# Altium footprint library PCBKU.PcbLib: 197 footprints (part 4 of 13)
Each footprint in its own frame and in the unit in brackets; x right, y up, seen from the top. Pads: shape width x height; smd on the part's side, far side on the other; paste and mask are expansions set on the pad; w line width, h text height; cw(c..) or ccw(c..) is an arc to the next point about the centre after c.
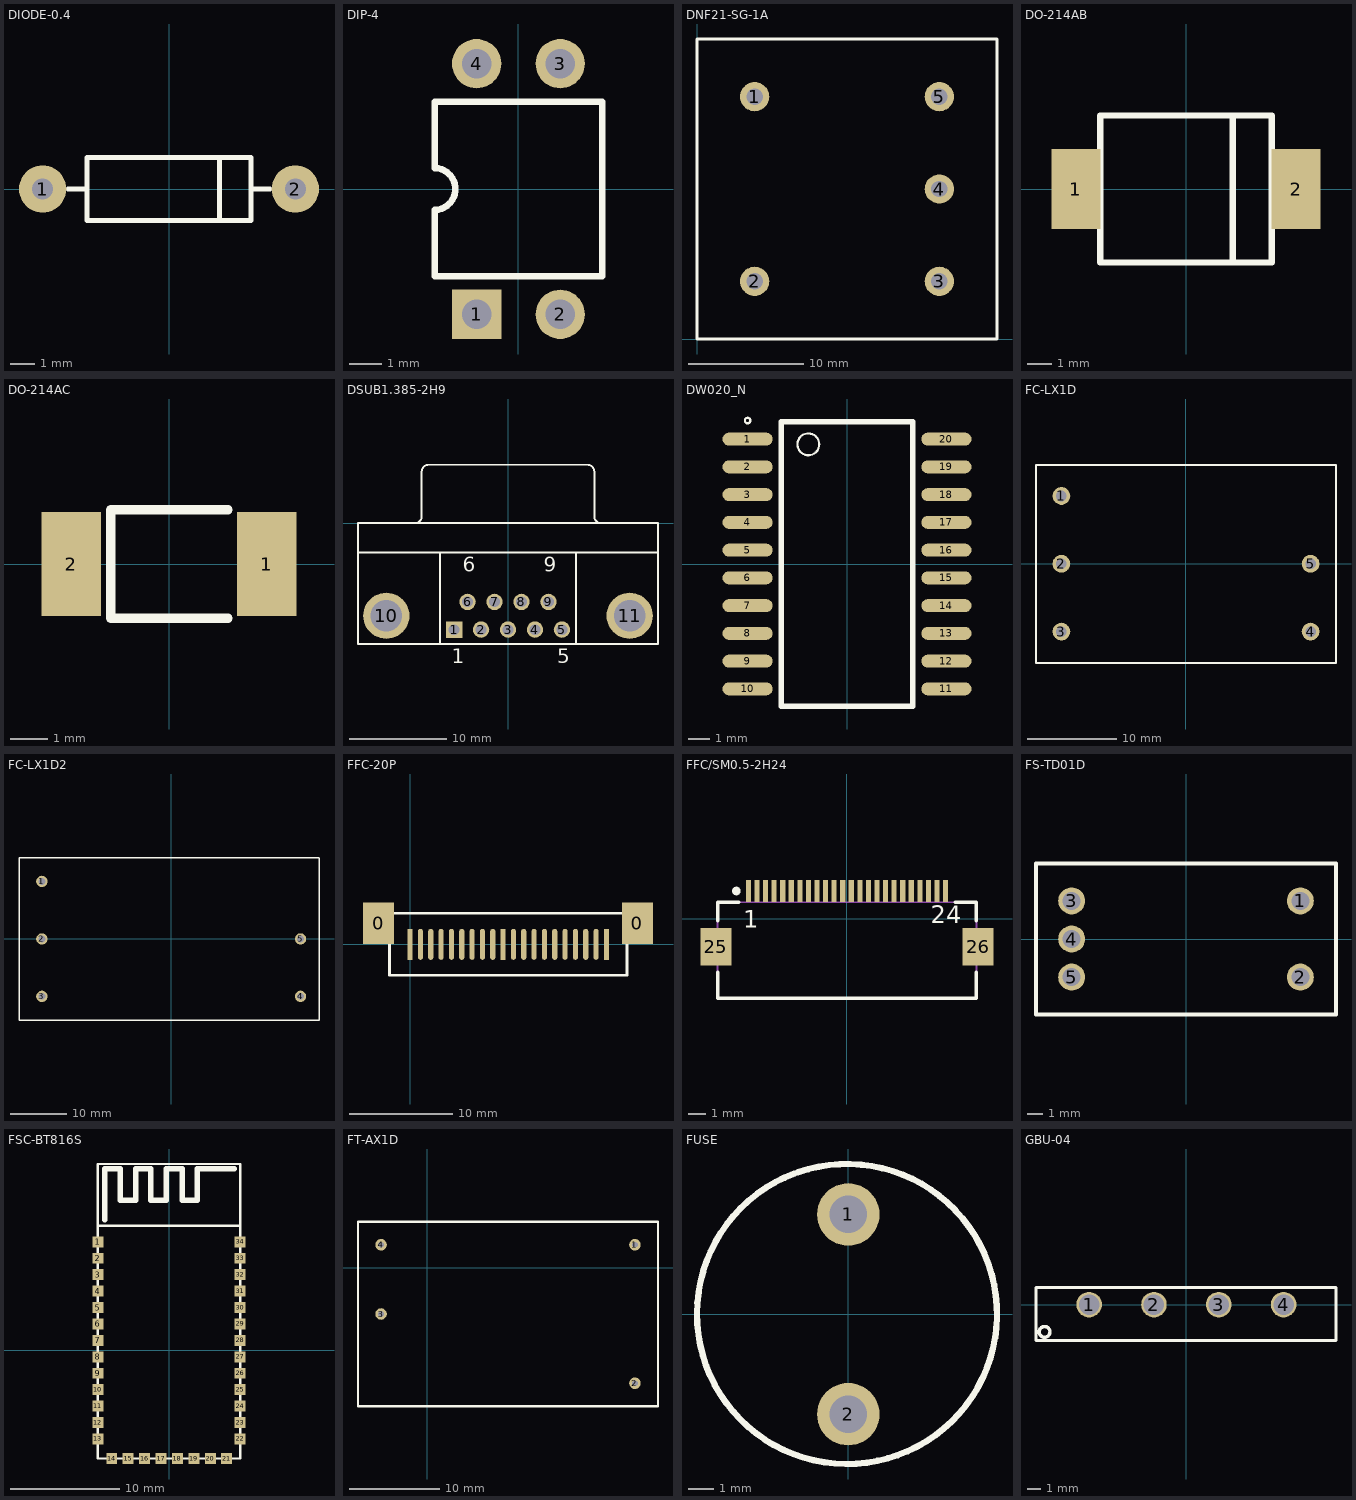
[diagram p3: the footprints below, top view; thin cyan lines are the x and y axes]

## DIODE-0.4 [mm]
pads (2):
  round 1.9 hole 0.85: 1(-5.08,0) 2(5.08,0)
Top Overlay:
  lines w0.2: -4.064,0 -3.302,0 ; 2.032,-1.27 2.032,1.27 ; 3.302,0 4.064,0 ; -3.302,-1.27 -3.302,1.27 3.302,1.27 3.302,-1.27 -3.302,-1.27
3D body: height 2, standoff -3.3, extent -5.53,-1.3 5.53,1.3

## DIP-4 [mm]
pads (4):
  rect 1.5x1.5 hole 0.9: 1(-1.27,-3.81)
  round 1.5 hole 0.9: 2(1.27,-3.81) 3(1.27,3.81) 4(-1.27,3.81)
Top Overlay:
  lines w0.2: -2.55,-2.65 2.55,-2.65 2.55,2.65 -2.55,2.65 -2.55,0.635 cw(c-2.55,0) -2.55,-0.635 -2.55,-2.65
3D body: height 3.8, standoff -3.5, extent -2.269,-3.986 2.311,3.884

## DNF21-SG-1A [mm]
height 1.1
pads (5):
  round 2.54 hole 1.397: 1(5,21) 2(5,5) 3(21,5) 4(21,13) 5(21,21)
Top Overlay:
  lines w0.25: 0,0 0,26 26,26 26,0 0,0

## DO-214AB [mm]
pads (2):
  rect 2x3.25 smd: 1(-4.5,0) 2(4.5,0)
Top Overlay:
  lines w0.254: 1.905,-3 1.905,3 ; -3.5,-3 3.5,-3 3.5,3 -3.5,3 -3.5,-3

## DO-214AC [mm]
pads (2):
  rect 1.6x2.8 smd: 1(2.623,0) 2(-2.623,0)
Top Overlay:
  lines w0.254: 1.582,-1.45 -1.568,-1.45 -1.568,1.45 1.582,1.45
3D body: height 2.24, standoff -0.04, extent -2.743,-1.346 2.743,1.448

## DSUB1.385-2H9 [mm] "Connector; D Subminiature; 9 Position; Right Angle; Pitch 1.385 mm"
height 12.75
pads (11):
  rect 1.69x1.69 hole 1.09: 1(-5.54,-10.92)
  round 1.69 hole 1.09: 2(-2.77,-10.92) 3(0,-10.92) 4(2.77,-10.92) 5(5.54,-10.92) 6(-4.155,-8.08) 7(-1.385,-8.08) 8(1.385,-8.08) 9(4.155,-8.08)
  round 4.76 hole 3.26: 10(-12.495,-9.5) 11(12.495,-9.5)
Top Overlay:
  lines w0.2: -15.4,-3 15.4,-3 ; -9.56,0.005 ccw(c-9.56,0.7) -8.865,0.7 -8.865,5.3 ; -8.86,5.305 cw(c-8.165,5.305) -8.165,6 8.165,6 cw(c8.165,5.305) 8.86,5.305 ; -7,-12.4 -7,-3 ; 7,-12.4 7,-3 ; 8.865,5.3 8.865,0.7 ccw(c9.56,0.7) 9.56,0.005 ; -15.4,-12.4 15.4,-12.4 15.4,0 -15.4,0 -15.4,-12.4
  text "6" at -4.655,-4.975 h1.5
  text "9" at 3.655,-4.975 h1.5
  text "5" at 5.04,-14.375 h1.5
  text "1" at -5.79,-14.375 h1.5

## DW020_N [mm]
height 1.1
pads (20):
  oval 2.3x0.6 smd: 1(-4.55,5.725) 2(-4.55,4.455) 3(-4.55,3.185) 4(-4.55,1.915) 5(-4.55,0.645) 6(-4.55,-0.625) 7(-4.55,-1.895) 8(-4.55,-3.165) 9(-4.55,-4.435) 10(-4.55,-5.705) 11(4.55,-5.705) 12(4.55,-4.435) 13(4.55,-3.165) 14(4.55,-1.895) 15(4.55,-0.625) 16(4.55,0.645) 17(4.55,1.915) 18(4.55,3.185) 19(4.55,4.455) 20(4.55,5.725)
Top Overlay:
  circle w0.1: c-1.77,5.486 r0.5
  circle w0.1: c-4.55,6.575 r0.125
  lines w0.25: -3,-6.49 3,-6.49 3,6.51 -3,6.51 -3,-6.49

## FC-LX1D [mm]
height 1.1
pads (5):
  round 2 hole 1.2: 1(-13.999,7.62) 2(-13.999,0) 3(-13.999,-7.62) 4(13.999,-7.62) 5(13.999,0)
Top Overlay:
  lines w0.254: 16.849,11.104 16.849,-11.151 -16.849,-11.151 -16.849,11.1 16.851,11.1
3D body: height 18, standoff -6, extent -16.825,-11.024 16.875,11.176

## FC-LX1D2 [mm]
height 1.1
pads (5):
  round 2 hole 1.2: 1(-22.86,10.16) 2(-22.86,-0.025) 3(-22.86,-10.16) 4(22.86,-10.16) 5(22.86,-0.025)
Top Overlay:
  lines w0.254: -26.9,-14.425 -26.9,14.375 26.1,14.375 ; -26.875,-14.429 26.125,-14.429 26.125,14.349

## FFC-20P [mm]
height 1.1
pads (22):
  rect 3x4 smd: 0(-3.048,2.032) 0(22,2.032)
  rect 0.5x3 smd: 1(0,0) 10(9,0) 20(19,0)
  oval 0.5x3 smd: 2(1,0) 3(2,0) 4(3,0) 5(4,0) 6(5,0) 7(6,0) 8(7,0) 9(8,0) 11(10,0) 12(11,0) 13(12,0) 14(13,0) 15(14,0) 16(15,0) 17(16,0) 18(17,0) 19(18,0)
Top Overlay:
  lines w0.25: -2,-3 21,-3 21,3 -2,3 -2,0 -2,-3

## FFC/SM0.5-2H24 [mm]
pads (26):
  rect 0.3x1.3 smd: 1(-5.75,1.625) 2(-5.25,1.625) 3(-4.75,1.625) 4(-4.25,1.625) 5(-3.75,1.625) 6(-3.25,1.625) 7(-2.75,1.625) 8(-2.25,1.625) 9(-1.75,1.625) 10(-1.25,1.625) 11(-0.75,1.625) 12(-0.25,1.625) 13(0.25,1.625) 14(0.75,1.625) 15(1.25,1.625) 16(1.75,1.625) 17(2.25,1.625) 18(2.75,1.625) 19(3.25,1.625) 20(3.75,1.625) 21(4.25,1.625) 22(4.75,1.625) 23(5.25,1.625) 24(5.75,1.625)
  rect 1.8x2.2 smd: 25(-7.65,-1.625) 26(7.65,-1.625)
Top Overlay:
  circle w0.25: c-6.45,1.625 r0.125
  lines w0.2: -7.55,-3.125 -7.55,-4.625 7.55,-4.625 7.55,-3.125 ; -7.55,-0.125 -7.55,0.975 -6.3,0.975 ; 6.3,0.975 7.55,0.975 7.55,-0.125
  text "1" at -6.045,-0.508 h1.02
  text "24" at 4.877,-0.254 h1.02
Mechanical 13:
  lines w0.1: -7.55,-4.625 7.55,-4.625 7.55,0.975 -7.55,0.975 -7.55,-4.625
3D body: height 2, standoff 0, extent -7.55,-4.625 7.55,0.975

## FS-TD01D [mm]
height 1.1
pads (5):
  round 1.8 hole 1.2: 1(7.62,2.54) 2(7.62,-2.54) 3(-7.62,2.54) 4(-7.62,0) 5(-7.62,-2.54)
Top Overlay:
  lines w0.254: -10,-5.04 10,-5.04 10,5.04 -10,5.04 -10,-5.04

## FSC-BT816S [mm]
pads (34):
  rect 1x1 smd: 1(-6.5,9.895) 2(-6.5,8.395) 3(-6.5,6.895) 4(-6.5,5.395) 5(-6.5,3.895) 6(-6.5,2.395) 7(-6.5,0.895) 8(-6.5,-0.605) 9(-6.5,-2.105) 10(-6.5,-3.605) 11(-6.5,-5.105) 12(-6.5,-6.605) 13(-6.5,-8.105) 14(-5.23,-9.895) 15(-3.73,-9.895) 16(-2.23,-9.895) 17(-0.73,-9.895) 18(0.77,-9.895) 19(2.27,-9.895) 20(3.77,-9.895) 21(5.27,-9.895) 22(6.5,-8.105) 23(6.5,-6.605) 24(6.5,-5.105) 25(6.5,-3.605) 26(6.5,-2.105) 27(6.5,-0.605) 28(6.5,0.895) 29(6.5,2.395) 30(6.5,3.895) 31(6.5,5.395) 32(6.5,6.895) 33(6.5,8.395) 34(6.5,9.895)
Top Overlay:
  lines w0.203: -6.401,11.355 6.449,11.355 ; -6.5,-9.895 6.5,-9.895 6.5,17.005 -6.5,17.005 -6.5,-9.895
  lines w0.5: -5.85,11.905 -5.85,16.555 -4.45,16.555 -4.45,13.705 -3.05,13.705 -3.05,16.555 -1.65,16.555 -1.65,13.705 -0.25,13.705 -0.25,16.555 1.2,16.555 1.2,13.705 2.6,13.705 2.6,16.555 5.95,16.555

## FT-AX1D [mm]
pads (4):
  round 1.27 hole 0.635: 1(22.86,2.54) 2(22.86,-12.7) 3(-5.08,-5.08) 4(-5.08,2.54)
Top Overlay:
  lines w0.254: -7.62,-15.24 25.4,-15.24 25.4,5.08 -7.62,5.08 -7.62,-15.24

## FUSE [mm]
pads (2):
  round 2.5 hole 1.5: 1(0,3.994) 2(0,-3.994)
Top Overlay:
  lines w0.254: -2.152,5.633 ccw(c-0.051,0.013) -2.01,5.684

## GBU-04 [mm]
pads (4):
  round 1.905 hole 1.524: 1(-7.245,0) 2(-2.415,0) 3(2.415,0) 4(7.245,0)
Top Overlay:
  circle w0.254: c-10.562,-2.032 r0.402
  lines w0.203: -11.201,-2.667 11.15,-2.667 11.15,1.27 -11.201,1.27 -11.201,-2.667
3D body: height 21.25, standoff -15.25, extent -11.049,-2.413 10.951,1.087